# Altium footprint library General_Lib.PcbLib: 729 footprints (part 7 of 46)
Each footprint in its own frame and in the unit in brackets; x right, y up, seen from the top. Pads: shape width x height; smd on the part's side, far side on the other; paste and mask are expansions set on the pad; w line width, h text height; cw(c..) or ccw(c..) is an arc to the next point about the centre after c.
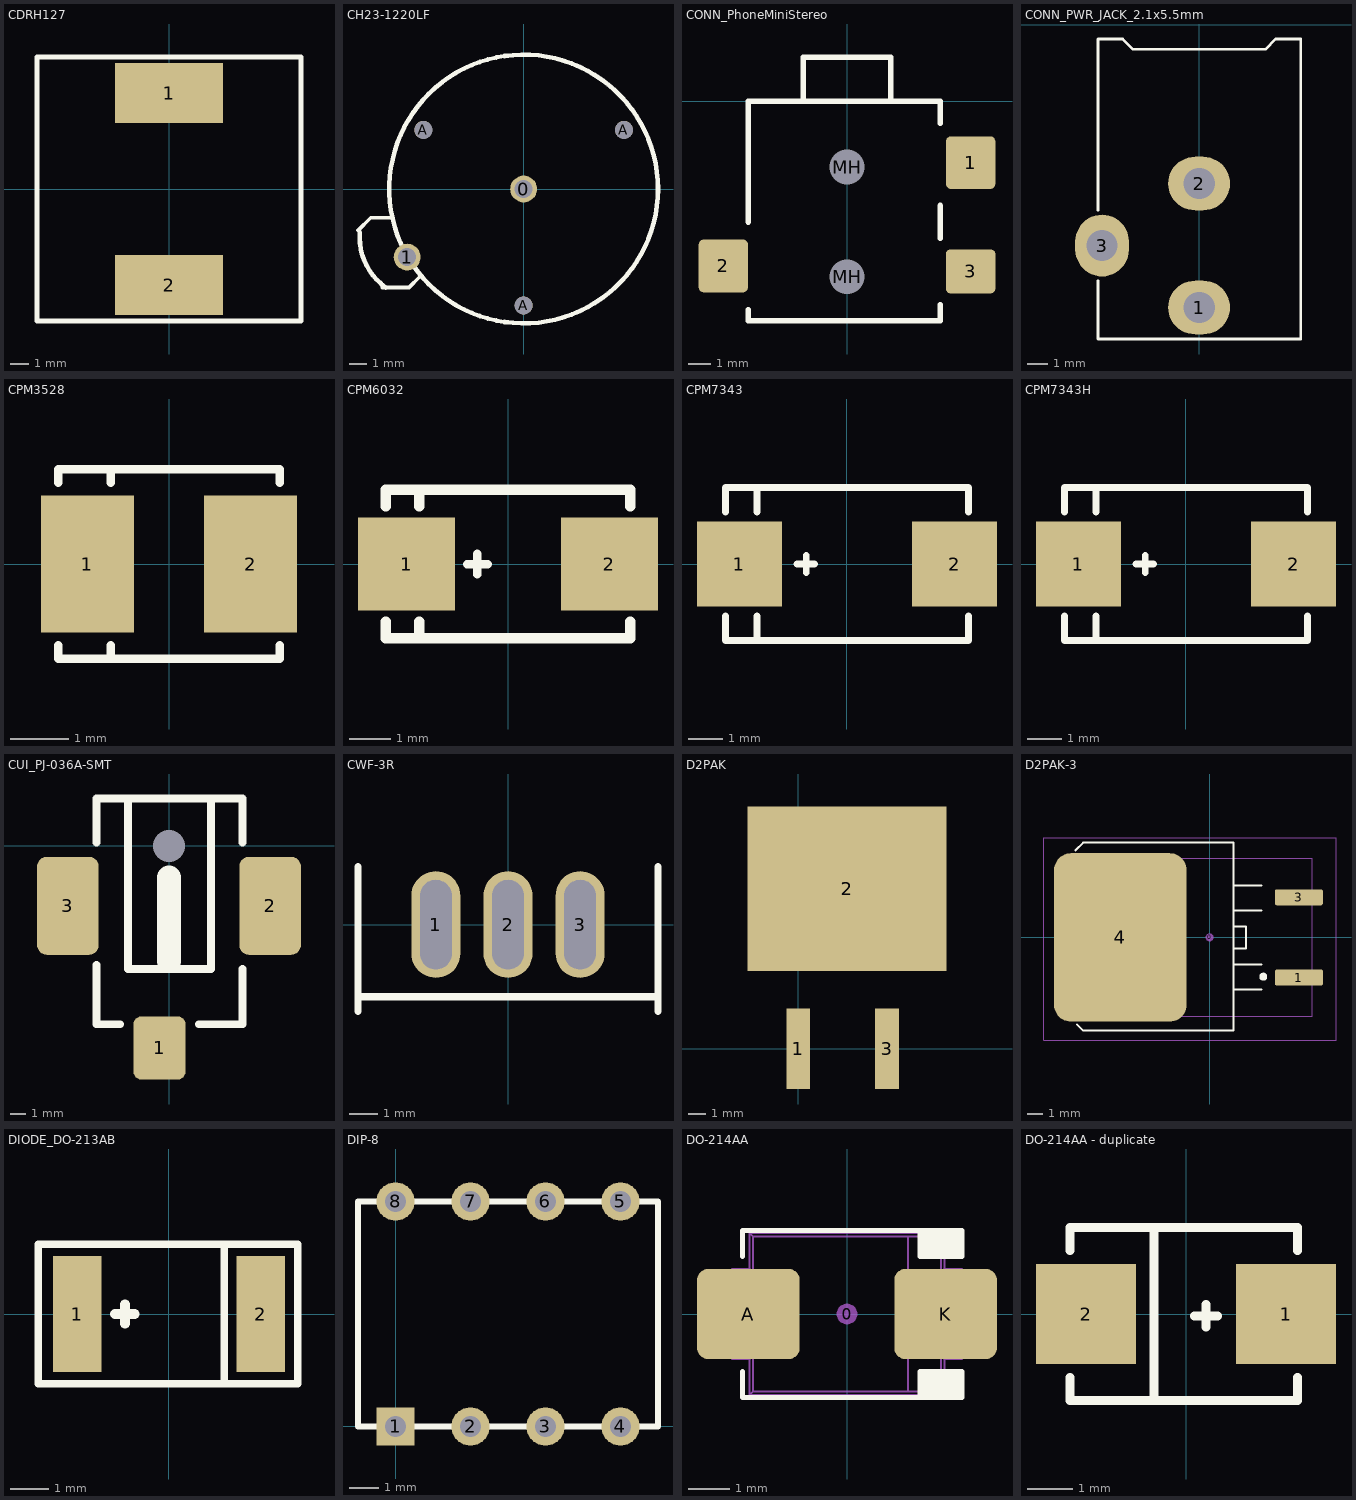
[diagram p6: the footprints below, top view; thin cyan lines are the x and y axes]

## CDRH127 [mm]
height 10
pads (2):
  rect 5.715x3.175 smd: 1(0,5.08) 2(0,-5.08)
Top Overlay:
  lines w0.254: -6.985,-6.985 6.985,-6.985 6.985,6.985 -6.985,6.985 -6.985,-6.985
3D body "CDRH125_LD.step": height 6.23, standoff -0.02, extent -6,-6.171 6,6.171

## CH23-1220LF [mm] "1220 Battary holder"
pads (5):
  round 1.5 hole 1: 0(0,0) 1(-6.5,-3.8)
  round 1 hole 1: A(-5.6,3.3) A(0,-6.5) A(5.6,3.3)
Top Overlay:
  circle w0.254: c0,0 r7.5
  lines w0.2: -9.245,-2.312 -8.534,-1.6 -7.3,-1.6 ; -7.9,-5.5 -6.4,-5.5 -5.8,-4.9
  lines w0.254: -9.145,-2.412 ccw(c-5.672,-2.669) -7.7,-5.5
3D body "bat23.stp": height 5.4, standoff -3, extent -8.811,-7.488 7.495,7.499

## CONN_PhoneMiniStereo [mm] "CUI SJ1-2513-SMT 2.5mm stereo jack"
height 4
pads (5):
  rrect20% 2.25x2.4 smd: 1(5.625,-2.8) 2(-5.625,-7.5)
  rrect20% 2.25x2 smd: 3(5.625,-7.75)
  round 1.524 hole 1.575 unplated: MH(0,-8) MH(0,-3)
Top Overlay:
  lines w0.254: -4.5,-9.5 -4.5,-10 4.25,-10 4.25,-9.275 ; -4.5,-5.5 -4.5,0 4.25,0 4.25,-1 ; -2,0 -2,2 2,2 2,0 ; 4.25,-6.25 4.25,-4.75
3D body "CUI-SJ1-2513-SMT.step": height 4.12, standoff -0.43, extent -6,-10 6,2

## CONN_PWR_JACK_2.1x5.5mm [mm] "Power Connector, 2.1mm ID, 5.5mm OD"
height 11
pads (3):
  oval 3x2.6 hole 1.511: 1(0,-13.7) 2(0,-7.7)
  oval 2.6x3 hole 1.511: 3(-4.7,-10.7)
Top Overlay:
  lines w0.127: -4.9,-12.4 -4.9,-15.225 4.925,-15.225 4.925,-0.7 3.7,-0.7 3.2,-1.2 -3.2,-1.2 -3.7,-0.7 -4.9,-0.7 -4.9,-9
Mechanical 13:
  lines w0.076: -4.9,-12.4 -4.9,-15.225 4.925,-15.225 4.925,-0.7 3.7,-0.7 3.2,-1.2 -3.2,-1.2 -3.7,-0.7 -4.9,-0.7 -4.9,-9
3D body "3100-522 Connector.stp": height 11, standoff -3.5, extent -4.9,-14.1 4.5,0

## CPM3528 [mm]
height 2
pads (2):
  rect 1.6x2.35 smd: 1(-1.4,0) 2(1.4,0)
Top Overlay:
  lines w0.15: -1.9,-1.4 -1.9,-1.625 1.9,-1.625 1.9,-1.4 ; -1.9,1.4 -1.9,1.625 1.9,1.625 1.9,1.4 ; -1,-1.625 -1,-1.4 ; -1,1.4 -1,1.625
3D body "CaseB_3528-21.step": height 1.9, standoff 0, extent -1.75,-1.4 1.75,1.4

## CPM6032 [mm]
height 5.08
pads (2):
  rect 2.35x2.25 smd: 1(-2.45,0) 2(2.45,0)
Top Overlay:
  lines w0.2: -0.99,-0.005 -0.49,-0.005 ; -0.74,-0.255 -0.74,0.245
  lines w0.254: -2.95,-1.4 -2.95,-1.8 2.95,-1.8 2.95,-1.4 ; -2.95,1.4 -2.95,1.8 2.95,1.8 2.95,1.4 ; -2.15,-1.8 -2.15,-1.4 ; -2.15,1.4 -2.15,1.8
3D body "cap_c.step": height 2.51, standoff 0, extent -2.997,-1.6 2.997,1.6

## CPM7343 [mm]
height 2
pads (2):
  rect 2.45x2.45 smd: 1(-3.1,0) 2(3.1,0)
Top Overlay:
  lines w0.2: -3.5,-1.5 -3.5,-2.2 3.5,-2.2 3.5,-1.5 ; -3.5,1.5 -3.5,2.2 3.5,2.2 3.5,1.5 ; -2.6,-2.2 -2.6,-1.5 ; -2.6,1.5 -2.6,2.2 ; -1.44,-0.005 -0.94,-0.005 ; -1.175,-0.25 -1.175,0.25
3D body "cap_d.step": height 2.81, standoff 0, extent -3.647,-2.15 3.647,2.15

## CPM7343H [mm]
pads (2):
  rect 2.45x2.45 smd: 1(-3.1,0) 2(3.1,0)
Top Overlay:
  lines w0.2: -3.5,-1.5 -3.5,-2.2 3.5,-2.2 3.5,-1.5 ; -3.5,1.5 -3.5,2.2 3.5,2.2 3.5,1.5 ; -2.6,-2.2 -2.6,-1.5 ; -2.6,1.5 -2.6,2.2 ; -1.44,-0.005 -0.94,-0.005 ; -1.175,-0.25 -1.175,0.25
3D body "7343H_new.stp": height 3.91, standoff 0, extent -3.956,-2.326 3.948,2.326

## CUI_PJ-036A-SMT [mm]
pads (4):
  rrect30% 3.3x4 smd: 1(-0.6,-12.8)
  rrect30% 3.9x6.2 smd: 2(6.4,-3.8) 3(-6.4,-3.8)
  rrect30% 0x0 hole 2.032 unplated: 4(0,0)
Top Overlay:
  lines w0.5: -4.6,-7.55 -4.6,-11.3 -3.1,-11.3 ; -4.6,0.2 -4.6,3 4.65,3 4.65,0.2 ; -2.6,3 -2.6,-7.8 2.65,-7.8 2.65,2.9 ; 1.9,-11.3 4.65,-11.3 4.65,-7.8
  lines w1.5: 0,-7.3 0,-2
3D body "CUI-PJ-036A-SMT.step": height 11.09, standoff -1.51, extent -7.5,-14.1 7.7,3

## CWF-3R [mm]
pads (3):
  oval 1.7x3.7 hole 1.1 slot 3.1 at 90 deg: 1(-2.5,0) 2(0,0) 3(2.5,0)
Top Overlay:
  lines w0.254: -5.2,-3 -5.2,2 ; -5.2,-2.5 5.2,-2.5 ; 5.2,-3 5.2,2
3D body "CWF-3R.STEP": height 5.7, standoff -3, extent -5,-9.8 5,2.4

## D2PAK [mm]
height 0
pads (3):
  rect 1.35x4.6 smd: 1(0,0) 3(5.08,0)
  rect 11.4x9.4 smd: 2(2.794,9.144)
3D body "D2PAK.step": height 4.83, standoff 0, extent -2.493,-2.033 8.177,13.847

## D2PAK-3 [mil] "D-PAK/TO-263-3; 3 Leads (1 Cropped); Body 14.7 (inc. leads) x 10.2 mm (LxW max)"
height 180
pads (4):
  round 20 on Mech15: 0(0,0)
  rrect25% 120x40 smd: 1(222.5,-100) 3(222.5,100)
  rrect25% 330x420 smd: 4(-222.5,0)
Top Overlay:
  circle w9.84: c133.8,-97.83 r4.92
  lines w5: -334.65,216.54 -314.96,236.22 59.06,236.22 59.06,-232.28 -314.96,-232.28 -330.71,-216.54 ; 129.92,-129.92 59.06,-129.92 59.06,-66.93 129.92,-66.93 ; 129.92,66.93 59.06,66.93 59.06,129.92 129.92,129.92 ; 59.06,-27.56 59.06,27.56 90.55,27.56 90.55,-27.56 59.06,-27.56
Mechanical 13:
  lines w3: -361.41,-196.85 255.51,-196.85 255.51,196.85 -361.41,196.85 -361.41,-196.85
Mechanical 15:
  lines w3: -413.39,-255.91 -413.39,248.03 314.96,248.03 314.96,-255.91 -413.39,-255.91
3D body "SW3dPS-TO263-3S.STEP": height 189.36, standoff 0.39, extent -361.41,-196.85 255.51,196.85

## DIODE_DO-213AB [mm]
height 4
pads (2):
  rect 1.25x3 smd: 1(-2.375,0) 2(2.375,0)
Top Overlay:
  lines w0.2: 1.425,-1.8 1.425,1.8 ; -3.375,-1.8 3.325,-1.8 3.325,1.8 -3.375,1.8 -3.375,-1.8
  lines w0.254: -1.391,0 -0.883,0 ; -1.137,-0.254 -1.137,0.254
3D body "DO-213AB.step": height 2.67, standoff 0, extent -2.6,-1.335 2.6,1.335

## DIP-8 [mm]
pads (8):
  rect 1.3x1.3 hole 0.7 unplated: 1(0,0)
  round 1.3 hole 0.7 unplated: 2(2.54,0) 3(5.08,0) 4(7.62,0) 5(7.62,7.62) 6(5.08,7.62) 7(2.54,7.62) 8(0,7.62)
Top Overlay:
  lines w0.2: -1.27,0 -1.27,7.62 8.89,7.62 8.89,0 -1.27,0

## DO-214AA [mm] "JEDEC DO214 variation AA. SMB"
height 2.65
pads (3):
  round 0.508 on Mech15: 0(0,0)
  rrect25% 2.5x2.2 smd: A(-2.4,0) K(2.4,0)
Top Overlay:
  region: 1.778,1.397 1.778,2.032 2.794,2.032 2.794,1.397
  region: 1.778,-1.397 1.778,-2.032 2.794,-2.032 2.794,-1.397
  lines w0.127: -2.54,-1.397 -2.54,-2.032 1.778,-2.032 ; -2.54,1.397 -2.54,2.032 1.778,2.032 ; 1.778,-2.032 1.778,-1.397 2.794,-1.397 2.794,-2.032 1.778,-2.032 ; 1.778,2.032 2.794,2.032 2.794,1.397 1.778,1.397 1.778,2.032
Mechanical 13:
  lines w0.05: -2.375,-1.1 -2.375,-1.973 ; -2.375,1.1 -2.375,1.973 ; 2.375,-1.1 2.375,-1.973 ; 2.375,1.1 2.375,1.973 ; -2.375,-1.973 -2.373,-1.975 2.373,-1.975 2.375,-1.973 ; -2.375,-1.973 -2.285,-1.883 ; -2.375,1.973 -2.373,1.975 2.373,1.975 2.375,1.973 ; -2.375,1.973 -2.285,1.883 ; -2.285,-1.883 1.485,-1.884 ; -2.285,-1.883 -2.285,1.883 ; -2.285,1.883 1.485,1.884 ; 1.485,-1.884 2.285,-1.884 ; 1.485,-1.884 1.485,1.884 ; 1.485,1.884 2.285,1.884 ; 2.285,-1.884 2.285,1.884 ; 2.285,-1.884 2.375,-1.973 ; 2.285,1.884 2.375,1.973 ; -2.8,-1.1 -2.356,-1.1 -2.356,1.1 -2.8,1.1 -2.8,-1.1 ; 2.356,-1.1 2.8,-1.1 2.8,1.1 2.356,1.1 2.356,-1.1
3D body "DO-214AA.STEP": height 2.62, standoff 0, extent -2.8,-1.975 2.8,1.975

## DO-214AA - duplicate [mm]
height 4
pads (2):
  rect 2.2x2.2 smd: 1(2.2,0) 2(-2.2,0)
Top Overlay:
  lines w0.2: -2.55,-1.4 -2.55,-1.9 2.45,-1.9 2.45,-1.4 ; -2.55,1.4 -2.55,1.9 2.45,1.9 2.45,1.4 ; -0.7,-1.9 -0.7,1.9 ; 0.19,-0.04 0.69,-0.04 ; 0.44,-0.29 0.44,0.21
3D body "DO-214AA.step": height 2.3, standoff 0, extent -2.75,-1.8 2.65,1.8